# Altium footprint library Ryś_PCB.PcbLib: 23 footprints (part 2 of 2)
Each footprint in its own frame and in the unit in brackets; x right, y up, seen from the top. Pads: shape width x height; smd on the part's side, far side on the other; paste and mask are expansions set on the pad; w line width, h text height; cw(c..) or ccw(c..) is an arc to the next point about the centre after c.
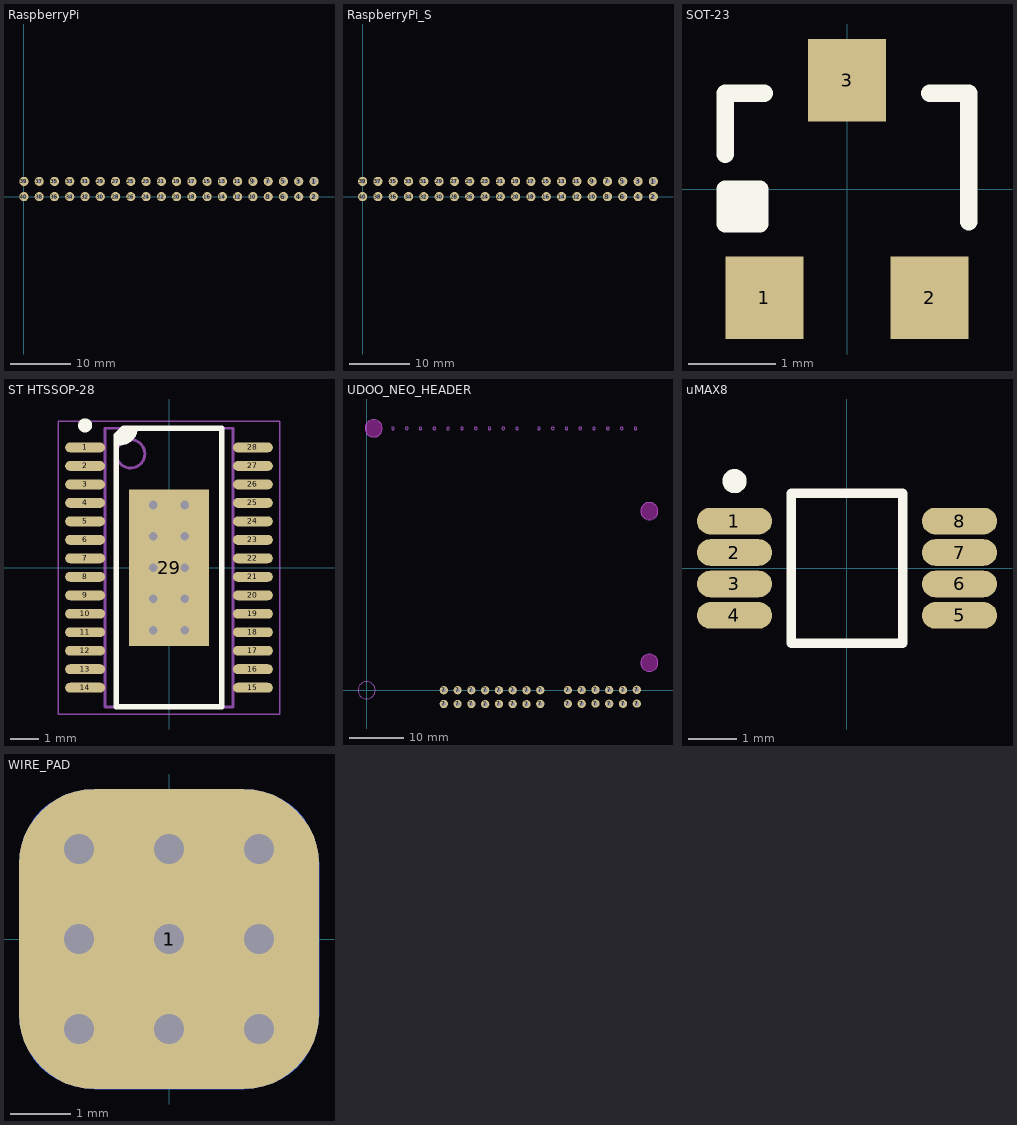
[diagram p1: the footprints below, top view; thin cyan lines are the x and y axes]

## RaspberryPi [mil] "singleboard_computer_40PIN_header"
pads (40):
  round 60 hole 35: 1(1900,100)
  round 60 hole 30: 2(1900,0) 3(1800,100) 4(1800,0) 5(1700,100) 6(1700,0) 7(1600,100) 8(1600,0) 9(1500,100) 10(1500,0) 11(1400,100) 12(1400,0) 13(1300,100) 14(1300,0) 15(1200,100) 16(1200,0) 17(1100,100) 18(1100,0) 19(1000,100) 20(1000,0) 21(900,100) 22(900,0) 23(800,100) 24(800,0) 25(700,100) 26(700,0) 27(600,100) 28(600,0) 29(500,100) 30(500,0) 31(400,100) 32(400,0) 33(300,100) 34(300,0) 35(200,100) 36(200,0) 37(100,100) 38(100,0) 39(0,100) 40(0,0)
Bottom Overlay:
  circle w19.68: c1900.16,0.1 r32.5
  circle w19.68: c1800.16,100.1 r32.5
  circle w19.68: c1800.16,0.1 r32.5
  circle w19.68: c1700.16,100.1 r32.5
  circle w19.68: c1700.16,0.1 r32.5
  circle w19.68: c1600.16,100.1 r32.5
  circle w19.68: c1600.16,0.1 r32.5
  circle w19.68: c1500.16,100.1 r32.5
  circle w19.68: c1500.16,0.1 r32.5
  circle w19.68: c1400.16,100.1 r32.5
  circle w19.68: c1400.16,0.1 r32.5
  circle w19.68: c1300.16,100.1 r32.5
  circle w19.68: c1300.16,0.1 r32.5
  circle w19.68: c1200.16,100.1 r32.5
  circle w19.68: c1200.16,0.1 r32.5
  circle w19.68: c1100.16,100.1 r32.5
  circle w19.68: c1100.16,0.1 r32.5
  circle w19.68: c1000.16,100.1 r32.5
  circle w19.68: c1000.16,0.1 r32.5
  circle w19.68: c900.16,100.1 r32.5
  circle w19.68: c900.16,0.1 r32.5
  circle w19.68: c800.16,100.1 r32.5
  circle w19.68: c800.16,0.1 r32.5
  circle w19.68: c700.16,100.1 r32.5
  circle w19.68: c700.16,0.1 r32.5
  circle w19.68: c600.16,100.1 r32.5
  circle w19.68: c600.16,0.1 r32.5
  circle w19.68: c500.16,100.1 r32.5
  circle w19.68: c500.16,0.1 r32.5
  circle w19.68: c400.16,100.1 r32.5
  circle w19.68: c400.16,0.1 r32.5
  circle w19.68: c300.16,100.1 r32.5
  circle w19.68: c300.16,0.1 r32.5
  circle w19.68: c200.16,100.1 r32.5
  circle w19.68: c200.16,0.1 r32.5
  circle w19.68: c100.16,100.1 r32.5
  circle w19.68: c100.16,0.1 r32.5
  circle w19.68: c0.16,100.1 r32.5
  circle w19.68: c0.16,0.1 r32.5
  lines w19.68: 1867.66,67.6 1867.66,132.6 1932.66,132.6 1932.66,67.6 1867.66,67.6
3D body "User Library-PBD2_54-40.step": height 92.52, standoff -344.49, extent -49.21,-49.21 1950.79,150.79
3D body "User Library-Raspberry Pi 3.step": height 164.96, standoff -596.46, extent -1216.42,-85.63 2223.43,2170.7

## RaspberryPi_S [mil] "singleboard_computer_40PIN_header"
pads (40):
  round 60 hole 35: 1(1900,100)
  round 60 hole 30: 2(1900,0) 3(1800,100) 4(1800,0) 5(1700,100) 6(1700,0) 7(1600,100) 8(1600,0) 9(1500,100) 10(1500,0) 11(1400,100) 12(1400,0) 13(1300,100) 14(1300,0) 15(1200,100) 16(1200,0) 17(1100,100) 18(1100,0) 19(1000,100) 20(1000,0) 21(900,100) 22(900,0) 23(800,100) 24(800,0) 25(700,100) 26(700,0) 27(600,100) 28(600,0) 29(500,100) 30(500,0) 31(400,100) 32(400,0) 33(300,100) 34(300,0) 35(200,100) 36(200,0) 37(100,100) 38(100,0) 39(0,100) 40(0,0)
3D body "User Library-rpi.step": height 86.61, standoff -523.62, extent -1265.58,-70.86 2168.31,2321.73
3D body "User Library-PBD2_54-40.step": height 92.52, standoff -344.49, extent -49.21,-49.21 1950.79,150.79

## SOT-23 [mm] "SOT-23; 3 Leads; Body 3.0 x 2.6 mm, inc. leads (LxW max)"
height 1.1
pads (3):
  rect 0.9x0.95 smd: 1(-0.95,-1.25) 2(0.95,-1.25) 3(0,1.25)
Top Overlay:
  rectangle: -1.4,-0.4 -1,0
  lines w0.2: -1.4,0.4 -1.4,1.1 -0.95,1.1 ; 0.95,1.1 1.4,1.1 1.4,-0.375 ; -1.4,-0.4 -1.4,0 -1,0 -1,-0.4 -1.4,-0.4
3D body: height 0.2, standoff 0, extent -0.3,0.8 0.3,1.25
3D body: height 0.4, standoff 0.2, extent -0.3,0.5 0.3,1
3D body: height 0.2, standoff 0, extent -1.2,-1.25 -0.6,-0.8
3D body: height 0.4, standoff 0.2, extent -1.2,-1 -0.6,-0.5
3D body: height 0.4, standoff 0.2, extent 0.6,-1 1.2,-0.5
3D body: height 0.2, standoff 0, extent 0.6,-1.25 1.2,-0.8
3D body: height 1, standoff 0.1, extent -1.45,-0.7 1.45,0.7

## ST HTSSOP-28 [mm] "HTSSOP, 28-Leads, Body 9.70x4.40mm, Pitch 0.65mm, Thermal Pad 5.50x2.80mm, IPC Medium Density"
height 1.2
pads (29):
  oval 1.4x0.35 smd: 1(-2.95,4.225) 2(-2.95,3.575) 3(-2.95,2.925) 4(-2.95,2.275) 5(-2.95,1.625) 6(-2.95,0.975) 7(-2.95,0.325) 8(-2.95,-0.325) 9(-2.95,-0.975) 10(-2.95,-1.625) 11(-2.95,-2.275) 12(-2.95,-2.925) 13(-2.95,-3.575) 14(-2.95,-4.225) 15(2.95,-4.225) 16(2.95,-3.575) 17(2.95,-2.925) 18(2.95,-2.275) 19(2.95,-1.625) 20(2.95,-0.975) 21(2.95,-0.325) 22(2.95,0.325) 23(2.95,0.975) 24(2.95,1.625) 25(2.95,2.275) 26(2.95,2.925) 27(2.95,3.575) 28(2.95,4.225)
  rect 2.8x5.5 smd: 29(0,0)
via 0.55,-2.2 diameter 0.5 hole 0.3
via -0.55,-2.2 diameter 0.5 hole 0.3
via 0.55,-1.1 diameter 0.5 hole 0.3
via -0.55,-1.1 diameter 0.5 hole 0.3
via 0.55,0 diameter 0.5 hole 0.3
via -0.55,0 diameter 0.5 hole 0.3
via 0.55,1.1 diameter 0.5 hole 0.3
via -0.55,1.1 diameter 0.5 hole 0.3
via 0.55,2.2 diameter 0.5 hole 0.3
via -0.55,2.2 diameter 0.5 hole 0.3
Top Overlay:
  circle w0.25: c-2.95,5 r0.125
  region: -1.5,4.9 -1.2,4.9 -1.2,4.801 -1.276,4.617 -1.417,4.476 -1.601,4.4 -1.7,4.4 -1.8,4.4 -1.8,4.6
  lines w0.2: -1.8,4.4 -1.7,4.4 ccw(c-1.7,4.9) -1.2,4.9 ; -1.85,-4.9 -1.85,4.65 -1.6,4.9 1.85,4.9 1.85,-4.9 -1.85,-4.9
Mechanical 13:
  circle w0.1: c-1.35,4 r0.5
  lines w0.1: -2.25,-4.9 2.25,-4.9 2.25,4.9 -2.25,4.9 -2.25,-4.9
Mechanical 15:
  lines w0.05: -3.9,-5.15 3.9,-5.15 3.9,5.15 -3.9,5.15 -3.9,-5.15
  lines w0.1: -0.5,0 0.5,0 ; 0,-0.5 0,0.5
3D body: height 1.2, standoff 0.01, extent -2.25,-4.9 2.25,4.9

## UDOO_NEO_HEADER [mil]
pads (28):
  round 60 hole 31.5: 7(560.26,-100) 7(560.26,0) 7(660.26,-100) 7(660.26,0) 7(760.26,-100) 7(760.26,0) 7(860.26,-100.92) 7(860.26,-0.92) 7(960.26,-100) 7(960.26,0) 7(1060.26,-100) 7(1060.26,0) 7(1160.26,-100.92) 7(1160.26,-0.92) 7(1260.26,-100) 7(1260.26,0) 7(1460.26,-99.08) 7(1460.26,0.92) 7(1560.26,-99.08) 7(1560.26,0.92) 7(1660.26,-97.25) 7(1660.26,2.75) 7(1760.26,-99.08) 7(1760.26,0.92) 7(1860.26,-99.08) 7(1860.26,0.92) 7(1960.26,-97.25) 7(1960.26,2.75)
Keep-Out Layer:
  board cut-out: 1988.94,1299.08 1988.94,1292.93 1991.34,1280.85 1996.05,1269.48 2002.89,1259.24 2011.6,1250.54 2021.83,1243.7 2033.21,1238.98 2045.28,1236.58 2051.44,1236.58 2057.59,1236.58 2069.67,1238.98 2081.04,1243.7 2091.28,1250.54 2099.99,1259.24 2106.83,1269.48 2111.54,1280.85 2113.94,1292.93 2113.94,1299.08 2113.94,1305.24 2111.54,1317.31 2106.83,1328.69 2099.99,1338.92 2091.28,1347.63 2081.04,1354.47 2069.67,1359.18 2057.59,1361.58 2051.44,1361.58 2045.28,1361.58 2033.21,1359.18 2021.83,1354.47 2011.6,1347.63 2002.89,1338.92 1996.05,1328.69 1991.34,1317.31 1988.94,1305.24
  board cut-out: 1988.94,199.08 1988.94,192.93 1991.34,180.85 1996.05,169.48 2002.89,159.24 2011.6,150.54 2021.83,143.7 2033.21,138.98 2045.28,136.58 2051.44,136.58 2057.59,136.58 2069.67,138.98 2081.04,143.7 2091.28,150.54 2099.99,159.24 2106.83,169.48 2111.54,180.85 2113.94,192.93 2113.94,199.08 2113.94,205.24 2111.54,217.31 2106.83,228.69 2099.99,238.92 2091.28,247.63 2081.04,254.47 2069.67,259.18 2057.59,261.58 2051.44,261.58 2045.28,261.58 2033.21,259.18 2021.83,254.47 2011.6,247.63 2002.89,238.92 1996.05,228.69 1991.34,217.31 1988.94,205.24
  board cut-out: 51.44,1836.58 45.28,1836.58 33.21,1838.98 21.83,1843.7 11.6,1850.54 2.89,1859.24 -3.95,1869.48 -8.66,1880.85 -11.06,1892.93 -11.06,1899.08 -11.06,1905.24 -8.66,1917.31 -3.95,1928.69 2.89,1938.92 11.6,1947.63 21.83,1954.47 33.21,1959.18 45.28,1961.58 51.44,1961.58 57.59,1961.58 69.67,1959.18 81.04,1954.47 91.28,1947.63 99.99,1938.92 106.83,1928.69 111.54,1917.31 113.94,1905.24 113.94,1899.08 113.94,1892.93 111.54,1880.85 106.83,1869.48 99.99,1859.24 91.28,1850.54 81.04,1843.7 69.67,1838.98 57.59,1836.58
Mechanical 1:
  circle w0.5: c191.44,1899.08 r10
  circle w0.5: c291.44,1899.08 r10
  circle w0.5: c391.44,1899.08 r10
  circle w0.5: c491.44,1899.08 r10
  circle w0.5: c591.44,1899.08 r10
  circle w0.5: c691.44,1899.08 r10
  circle w0.5: c791.44,1899.08 r10
  circle w0.5: c891.44,1899.08 r10
  circle w0.5: c991.44,1899.08 r10
  circle w0.5: c1091.44,1899.08 r10
  circle w0.5: c1250.26,1899.08 r10
  circle w0.5: c1350.26,1899.08 r10
  circle w0.5: c1450.26,1899.08 r10
  circle w0.5: c1550.26,1899.08 r10
  circle w0.5: c1650.26,1899.08 r10
  circle w0.5: c1750.26,1899.08 r10
  circle w0.5: c1850.26,1899.08 r10
  circle w0.5: c1950.26,1899.08 r10
  circle w0.5: c0.26,-0.92 r62.5
  circle w0.5: c2051.44,199.08 r62.5
  circle w0.5: c2051.44,1299.08 r62.5
  circle w0.5: c51.44,1899.08 r62.5

## uMAX8 [mm] "TSOP, 8-Leads, Body 3,00x3,00mm, Pitch 0,65mm, IPC Low Density"
height 1.1
pads (8):
  oval 1.55x0.55 smd: 1(-2.325,0.975) 2(-2.325,0.325) 3(-2.325,-0.325) 4(-2.325,-0.975) 5(2.325,-0.975) 6(2.325,-0.325) 7(2.325,0.325) 8(2.325,0.975)
Top Overlay:
  circle w0.25: c-2.325,1.8 r0.125
  lines w0.2: -1.15,-1.55 1.15,-1.55 1.15,1.55 -1.15,1.55 -1.15,-1.55
3D body "SW3dPS-uMAX8.STEP": height 0.95, standoff 0, extent -2.5,-1.5 2.5,1.5

## WIRE_PAD [mm]
pads (2):
  rrect50% 5x5 smd far side: 1(0,0)
  rrect50% 5x5 smd: 1(0,0)
via 0,1.5 diameter 1 hole 0.5
via 1.5,0 diameter 1 hole 0.5
via -1.5,0 diameter 1 hole 0.5
via 0,0 diameter 1 hole 0.5
via 0,-1.5 diameter 1 hole 0.5
via 1.5,-1.5 diameter 1 hole 0.5
via -1.5,-1.5 diameter 1 hole 0.5
via -1.5,1.5 diameter 1 hole 0.5
via 1.5,1.5 diameter 1 hole 0.5